# Altium footprint library Power_Lib_Altium.PcbLib: 383 footprints (part 1 of 24)
Each footprint in its own frame and in the unit in brackets; x right, y up, seen from the top. Pads: shape width x height; smd on the part's side, far side on the other; paste and mask are expansions set on the pad; w line width, h text height; cw(c..) or ccw(c..) is an arc to the next point about the centre after c.
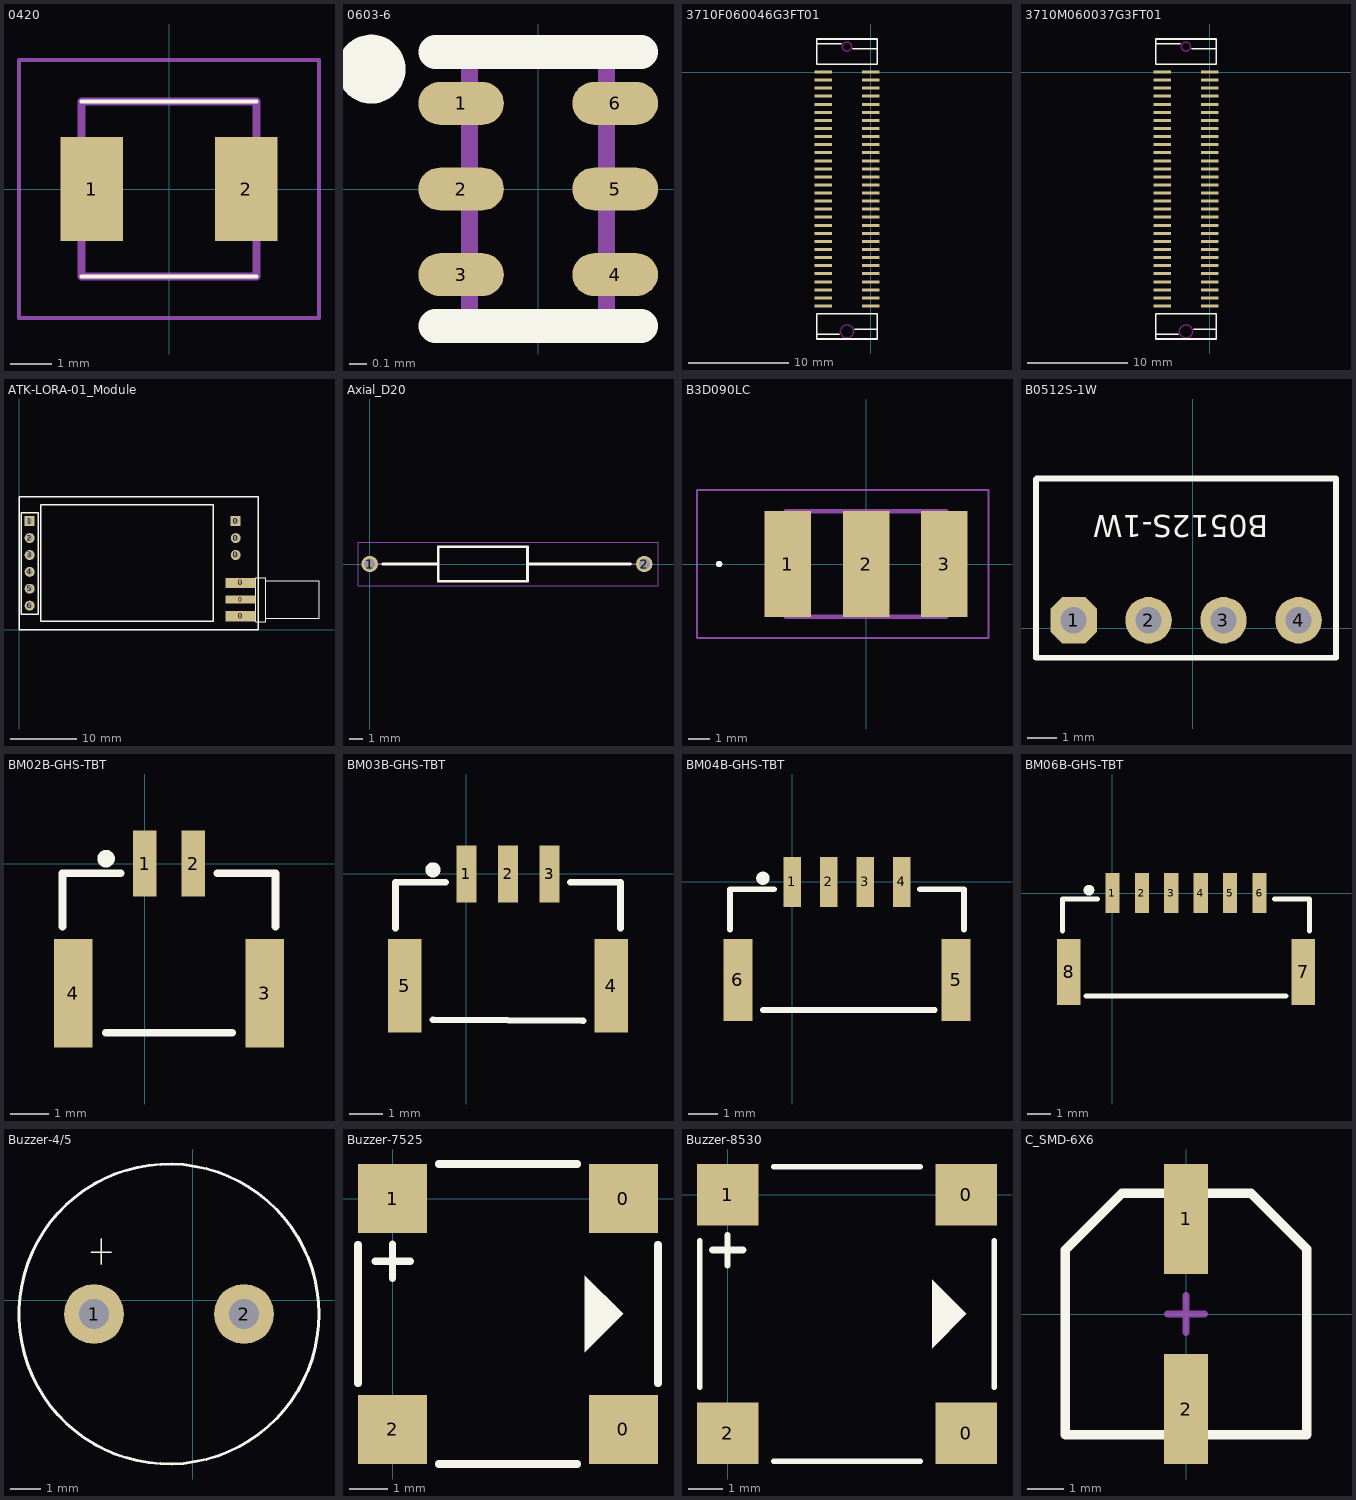
[diagram p0: the footprints below, top view; thin cyan lines are the x and y axes]

## 0420 [mm]
pads (2):
  rect 1.5x2.5 smd: 1(-1.85,0) 2(1.85,0)
Top Overlay:
  lines w0.1: -2.1,-2.1 2.1,-2.1 ; -2.1,2.1 2.1,2.1
Mechanical 13:
  lines w0.2: -2.1,-2.1 -2.1,2.1 2.1,2.1 2.1,-2.1 -2.1,-2.1
Mechanical 15:
  lines w0.1: -3.6,-3.1 -3.6,3.1 3.6,3.1 3.6,-3.1 -3.6,-3.1
3D body "0420CDMCCDS-150MC.stp": height 2.1, standoff 0, extent -2.45,-2.1 2.45,2.1

## 0603-6 [mm]
pads (6):
  oval 0.5x0.25 smd: 1(-0.45,0.5) 2(-0.45,0) 3(-0.45,-0.5) 4(0.45,-0.5) 5(0.45,0) 6(0.45,0.5)
Top Overlay:
  circle w0.25: c-0.976,0.7 r0.076
  lines w0.2: -0.6,-0.8 0.6,-0.8 ; -0.6,0.8 0.6,0.8
Mechanical 13:
  lines w0.1: -0.4,-0.8 -0.4,0.8 0.4,0.8 0.4,-0.8 -0.4,-0.8

## 3710F060046G3FT01 [mm]
pads (60):
  rect 1.7x0.3 smd: 1(-4.7,0) 2(-4.7,-0.8) 3(-4.7,-1.6) 4(-4.7,-2.4) 5(-4.7,-3.2) 6(-4.7,-4) 7(-4.7,-4.8) 8(-4.7,-5.6) 9(-4.7,-6.4) 10(-4.7,-7.2) 11(-4.7,-8) 12(-4.7,-8.8) 13(-4.7,-9.6) 14(-4.7,-10.4) 15(-4.7,-11.2) 16(-4.7,-12) 17(-4.7,-12.8) 18(-4.7,-13.6) 19(-4.7,-14.4) 20(-4.7,-15.2) 21(-4.7,-16) 22(-4.7,-16.8) 23(-4.7,-17.6) 24(-4.7,-18.4) 25(-4.7,-19.2) 26(-4.7,-20) 27(-4.7,-20.8) 28(-4.7,-21.6) 29(-4.7,-22.4) 30(-4.7,-23.2) 31(0,-23.2) 32(0,-22.4) 33(0,-21.6) 34(0,-20.8) 35(0,-20) 36(0,-19.2) 37(0,-18.4) 38(0,-17.6) 39(0,-16.8) 40(0,-16) 41(0,-15.2) 42(0,-14.4) 43(0,-13.6) 44(0,-12.8) 45(0,-12) 46(0,-11.2) 47(0,-10.4) 48(0,-9.6) 49(0,-8.8) 50(0,-8) 51(0,-7.2) 52(0,-6.4) 53(0,-5.6) 54(0,-4.8) 55(0,-4) 56(0,-3.2) 57(0,-2.4) 58(0,-1.6) 59(0,-0.8) 60(0,0)
Top Overlay:
  lines w0.152: -5.35,-26 -3.1,-26 ; -5.35,2.8 -2.9,2.8 ; -1.8,2.3 0.65,2.3 ; -1.6,-25.5 0.65,-25.5 ; 0.625,0.775 -5.35,0.775 -5.35,3.275 0.65,3.275 0.65,0.775 ; -5.35,-26.475 -5.35,-23.975 0.65,-23.975 0.65,-26.475 -5.35,-26.475
Keep-Out Layer:
  circle w0.152: c-2.35,2.525 r0.45
  circle w0.152: c-2.35,-25.725 r0.65

## 3710M060037G3FT01 [mm]
pads (60):
  rect 1.7x0.3 smd: 1(-4.7,0) 2(-4.7,-0.8) 3(-4.7,-1.6) 4(-4.7,-2.4) 5(-4.7,-3.2) 6(-4.7,-4) 7(-4.7,-4.8) 8(-4.7,-5.6) 9(-4.7,-6.4) 10(-4.7,-7.2) 11(-4.7,-8) 12(-4.7,-8.8) 13(-4.7,-9.6) 14(-4.7,-10.4) 15(-4.7,-11.2) 16(-4.7,-12) 17(-4.7,-12.8) 18(-4.7,-13.6) 19(-4.7,-14.4) 20(-4.7,-15.2) 21(-4.7,-16) 22(-4.7,-16.8) 23(-4.7,-17.6) 24(-4.7,-18.4) 25(-4.7,-19.2) 26(-4.7,-20) 27(-4.7,-20.8) 28(-4.7,-21.6) 29(-4.7,-22.4) 30(-4.7,-23.2) 31(0,-23.2) 32(0,-22.4) 33(0,-21.6) 34(0,-20.8) 35(0,-20) 36(0,-19.2) 37(0,-18.4) 38(0,-17.6) 39(0,-16.8) 40(0,-16) 41(0,-15.2) 42(0,-14.4) 43(0,-13.6) 44(0,-12.8) 45(0,-12) 46(0,-11.2) 47(0,-10.4) 48(0,-9.6) 49(0,-8.8) 50(0,-8) 51(0,-7.2) 52(0,-6.4) 53(0,-5.6) 54(0,-4.8) 55(0,-4) 56(0,-3.2) 57(0,-2.4) 58(0,-1.6) 59(0,-0.8) 60(0,0)
Top Overlay:
  lines w0.152: -5.35,-26 -3.1,-26 ; -5.35,2.8 -2.9,2.8 ; -1.8,2.3 0.65,2.3 ; -1.6,-25.5 0.65,-25.5 ; 0.625,0.775 -5.35,0.775 -5.35,3.275 0.65,3.275 0.65,0.775 ; -5.35,-26.475 0.65,-26.475 0.65,-23.975 -5.35,-23.975 -5.35,-26.475
Keep-Out Layer:
  circle w0.152: c-2.35,-25.725 r0.65
  circle w0.152: c-2.35,2.525 r0.45

## ATK-LORA-01_Module [mm] "正点原子Lora模块"
pads (12):
  round 1.5 hole 0.9: 0(32.595,11.253) 0(32.595,13.793) 2(1.607,13.798) 3(1.607,11.258) 4(1.607,8.718) 5(1.607,6.178) 6(1.607,3.638)
  rect 1.5x1.5 hole 0.9: 0(32.595,16.333) 1(1.607,16.338)
  rect 4.5x1.524 hole 0.5: 0(33.32,2.047) 0(33.32,7.047)
  rect 4.5x1.2 smd: 0(33.32,4.547)
Top Overlay:
  lines w0.1: 37.12,1.747 45.12,1.747 45.12,7.347 37.12,7.347 ; 35.62,1.247 37.12,1.247 37.12,7.847 35.62,7.847 35.62,1.247
  lines w0.2: 0,0 0,20 36,20 36,0 0,0 ; 0.337,2.368 0.337,17.608 2.877,17.608 2.877,2.368 0.337,2.368 ; 3.25,1.275 29.25,1.275 29.25,18.775 3.25,18.775 3.25,1.275

## Axial_D20 [mm]
pads (2):
  round 1.2 hole 0.8: 1(0,0) 2(20,0)
Top Overlay:
  lines w0.2: 0.95,0 5,0 ; 11.5,0 19,0 ; 5,-1.25 11.5,-1.25 11.5,1.25 5,1.25 5,-1.25
Mechanical 13:
  lines w0.1: 0,0 5,0 ; 11.5,0 13.625,0 18,0 20,0 ; 5,-1.25 11.5,-1.25 11.5,1.25 5,1.25 5,-1.25
Mechanical 15:
  lines w0.05: -0.85,-1.6 21,-1.6 21,1.6 -0.85,1.6 -0.85,-1.6

## B3D090LC [mm]
pads (3):
  rect 2.2x5 smd: 1(-3.7,0) 2(0,0) 3(3.7,0)
Top Overlay:
  lines w0.2: -7,0 ccw(c-6.95,0) -6.9,0 ; -7,0 cw(c-6.95,0) -6.9,0 ; -7,0 ccw(c-6.95,0) -6.9,0
Mechanical 13:
  lines w0.2: -3.8,-2.5 -3.8,2.5 3.8,2.5 3.8,-2.5 -3.8,-2.5
Mechanical 15:
  lines w0.1: -8,-3.5 -8,3.5 5.8,3.5 5.8,-3.5 -8,-3.5
3D body "B3D090L-C.stp": height 6.2, standoff 0, extent -4.58,-2.5 4.58,2.5

## B0512S-1W [mil]
pads (4):
  oct 62x62 hole 35: 1(-159,11)
  round 62 hole 35: 2(-59,11) 3(41,11) 4(141,11)
Top Overlay:
  lines w7.87: -209,-39 -209,199 -208,200 191,200 191,-39
  lines w8: -209,-39 191,-39
  text "B0512S-1W" at 101,161 h50

## BM02B-GHS-TBT [mm] "GH02立式"
height 4.05
pads (4):
  rect 0.6x1.7 smd: 1(0,0) 2(1.25,0)
  rect 1x2.8 smd: 3(3.1,-3.35) 4(-1.85,-3.35)
Top Overlay:
  circle w0.254: c-1,0.125 r0.1
  lines w0.2: -2.125,-1.625 -2.125,-0.25 -0.625,-0.25 ; -1,-4.375 2.25,-4.375 ; 1.875,-0.25 3.375,-0.25 3.375,-1.625
3D body "BM02B-GHS-TBT.STEP": height 4.18, standoff -0.03, extent -2.25,-4.45 3.5,0.5

## BM03B-GHS-TBT [mm] "GH03立式"
height 4.05
pads (5):
  rect 0.6x1.7 smd: 1(0,0) 2(1.25,0) 3(2.5,0)
  rect 1x2.8 smd: 4(4.35,-3.35) 5(-1.85,-3.35)
Top Overlay:
  circle w0.254: c-1,0.125 r0.1
  lines w0.2: -2.125,-1.625 -2.125,-0.25 -0.625,-0.25 ; -1,-4.375 3.5,-4.4 ; 3.125,-0.25 4.625,-0.25 4.625,-1.625
3D body "BM03B-GHS-TBT.STEP": height 4.18, standoff -0.03, extent -2.25,-4.45 4.75,0.5

## BM04B-GHS-TBT [mm] "GH04立式"
height 4.05
pads (6):
  rect 0.6x1.7 smd: 1(0,0) 2(1.25,0) 3(2.5,0) 4(3.75,0)
  rect 1x2.8 smd: 5(5.6,-3.35) 6(-1.85,-3.35)
Top Overlay:
  circle w0.254: c-1,0.125 r0.1
  lines w0.2: -2.125,-1.625 -2.125,-0.25 -0.625,-0.25 ; -1,-4.375 4.875,-4.375 ; 4.375,-0.25 5.875,-0.25 5.875,-1.625
3D body "BM04B-GHS-TBT.STEP": height 4.18, standoff -0.03, extent -2.275,-4.45 5.975,0.5

## BM06B-GHS-TBT [mm] "GH06立式"
height 4.05
pads (8):
  rect 0.6x1.7 smd: 1(0,0) 2(1.25,0) 3(2.5,0) 4(3.75,0) 5(5,0) 6(6.25,0)
  rect 1x2.8 smd: 7(8.1,-3.35) 8(-1.85,-3.35)
Top Overlay:
  circle w0.254: c-1,0.125 r0.1
  lines w0.2: -2.125,-1.625 -2.125,-0.25 -0.625,-0.25 ; -1.132,-4.369 7.375,-4.375 ; 6.875,-0.25 8.375,-0.25 8.375,-1.625
3D body "BM06B-GHS-TBT.STEP": height 4.18, standoff -0.03, extent -2.256,-4.405 8.494,0.545

## Buzzer-4/5 [mm] "蜂鸣器（小）直插脚距4-5mm"
pads (2):
  round 2 hole 1: 1(-3.285,-0.455) 2(1.715,-0.455)
Top Overlay:
  circle w0.1: c-0.785,-0.455 r5
  lines w0.051: -3.377,1.603 -2.717,1.603 ; -3.047,1.196 -3.047,2.06
3D body "User Library-HCM1005.SLDPRT": height 5.88, standoff -3.62, extent -5.686,-5.508 4.314,4.492

## Buzzer-7525 [mm]
pads (4):
  rect 1.8x1.8 smd: 0(6,-6) 0(6,0) 1(0,0) 2(0,-6)
Top Overlay:
  region: 5,-2 5,-4 6,-3
  lines w0.178: 0,-2.077 0,-1.177
  lines w0.2: -0.9,-4.8 -0.9,-1.2 ; 1.2,-6.9 4.8,-6.9 ; 1.2,0.9 4.8,0.9 ; 6.9,-4.8 6.9,-1.2
  lines w0.203: -0.45,-1.627 0.45,-1.627
3D body "buzzer_7525.step": height 2.55, standoff 0.04, extent -0.75,-6.75 6.75,0.75

## Buzzer-8530 [mm]
pads (4):
  rect 1.8x1.8 smd: 0(7,-7) 0(7,0) 1(0,0) 2(0,-7)
Top Overlay:
  region: 6,-2.5 6,-4.5 7,-3.5
  lines w0.152: -0.818,-5.659 -0.818,-1.341 ; 1.341,-7.818 5.659,-7.818 ; 1.341,0.818 5.659,0.818 ; 7.818,-5.659 7.818,-1.341
  lines w0.178: 0,-2.077 0,-1.177
  lines w0.203: -0.45,-1.627 0.45,-1.627

## C_SMD-6X6 [mm]
pads (2):
  rect 1.2x3 smd: 1(0,2.6) 2(0,-2.6)
Top Overlay:
  lines w0.254: -3.3,-3.3 -3.3,1.75 -1.75,3.3 1.775,3.3 3.3,1.775 3.3,-3.3 -3.3,-3.3
Mechanical 15:
  lines w0.2: -0.5,0 0.5,0 ; 0,-0.5 0,0.5
3D body "User Library-CAP SMD SVP 6_3x5_9.STEP": height 5.9, standoff 0, extent -3.3,-3.65 3.3,3.65